# Altium footprint library SOURIAU THD.PcbLib: 34 footprints (part 5 of 5)
Each footprint in its own frame and in the unit in brackets; x right, y up, seen from the top. Pads: shape width x height; smd on the part's side, far side on the other; paste and mask are expansions set on the pad; w line width, h text height; cw(c..) or ccw(c..) is an arc to the next point about the centre after c.
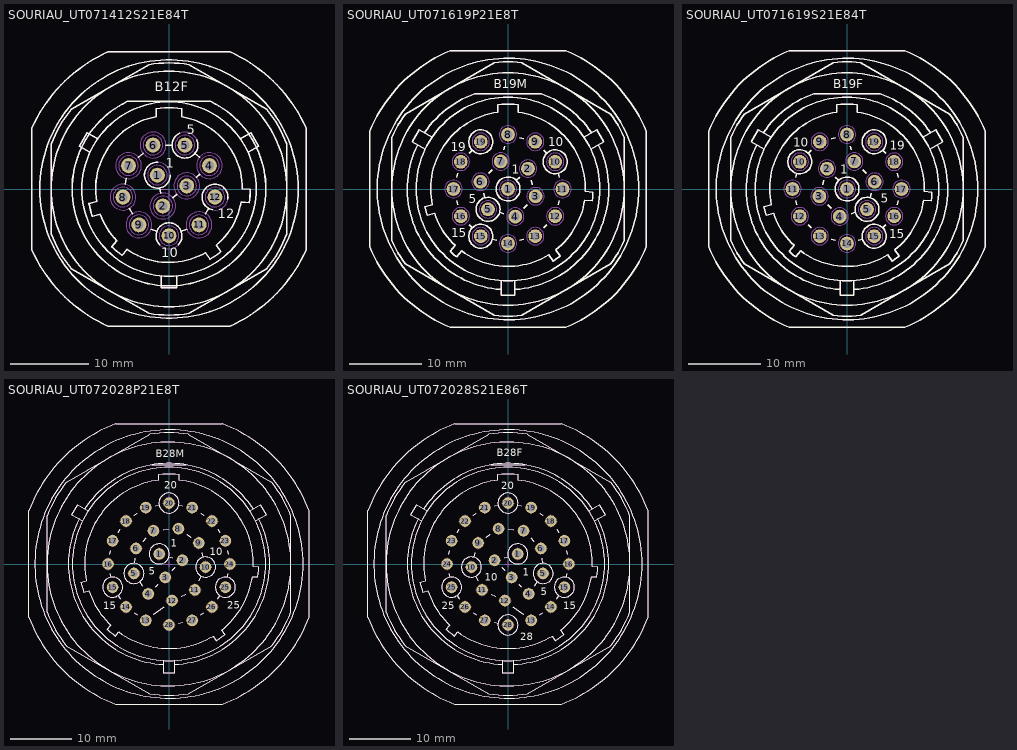
[diagram p4: the footprints below, top view; thin cyan lines are the x and y axes]

## SOURIAU_UT071412S21E84T [mm] "Metal Circular Connector, 12 Female Contacts, Shell Size 14, UT07 Series"
height 24.3
pads (12):
  round 1.9 hole 1.2: 1(-1.478,1.762) 2(-0.787,-2.161) 3(2.265,0.399) 4(5.153,2.975) 5(2.035,5.591) 6(-2.035,5.591) 7(-5.153,2.975) 8(-5.86,-1.033) 9(-3.825,-4.558) 10(0,-5.95) 11(3.825,-4.558) 12(5.86,-1.033)
Top Overlay:
  circle w0.2: c0,0 r11.1
  circle w0.2: c0,0 r16.45
  circle w0.2: c0,0 r15
  lines w0.2: -10.074,4.661 -11.412,5.434 -10.412,7.166 -9.074,6.393 ; -5.573,0.592 -5.439,1.35 ; -5.281,11.15 ccw(c0,0) 5.281,11.15 ; -5.241,11.195 5.321,11.195 ; -5.035,-2.462 -4.65,-3.129 ; -3.889,4.036 -3.299,4.531 ; -2.274,-5.122 -1.55,-5.386 ; -1.454,3.412 ccw(c-1.478,1.762) 0.172,1.772 ; -1.192,0.137 -1.073,-0.536 ; -1.167,-7.117 cw(c0,-5.95) 1.167,-7.117 ; -1,-11.055 -1,-12.6 1,-12.6 1,-11.055 ; -0.385,5.591 0.385,5.591 ; 0.477,-1.101 1.001,-0.661 ; 1.338,7.087 ccw(c2.035,5.591) 3.53,6.288 ; 1.55,-5.386 2.274,-5.122 ; 3.299,4.531 3.889,4.036 ; 3.496,1.498 3.921,1.877 ; 4.65,-3.129 5.035,-2.462 ; 5.573,-2.658 cw(c5.86,-1.033) 7.485,-1.32 ; 9.074,6.393 10.412,7.166 11.412,5.434 10.074,4.661 ; -17.45,-7.766 ccw(c0,0) -7.766,-17.45 7.766,-17.45 ccw(c0,0) 17.45,-7.766 17.45,7.766 ccw(c0,0) 7.766,17.45 -7.766,17.45 ccw(c0,0) -17.45,7.766 -17.45,-7.766 ; -15,-5.71 ccw(c0,0) -12.445,-10.135 -2.555,-15.845 ccw(c0,0) 2.555,-15.845 12.445,-10.135 ccw(c0,0) 15,-5.71 15,5.71 ccw(c0,0) 12.445,10.135 2.555,15.845 ccw(c0,0) -2.555,15.845 -12.445,10.135 ccw(c0,0) -15,5.71 -15,-5.71 ; -10.184,-1.849 ccw(c0,0) -9.744,-3.491 -8.774,-3.231 ccw(c0,0) -6.636,-6.586 -7.282,-7.355 ccw(c0,0) -5.979,-8.448 -5.334,-7.679 ccw(c0,0) 4.644,-8.115 5.22,-8.937 ccw(c0,0) 6.613,-7.962 6.037,-7.14 ccw(c0,0) 9.202,-1.658 10.202,-1.746 ccw(c0,0) 10.35,-0.052 9.35,0.035 ccw(c0,0) 1.65,9.203 1.65,10.218 ccw(c0,0) -1.65,10.218 -1.65,9.203 ccw(c0,0) -9.214,-1.589 -10.184,-1.849
  text "B12F" at -1.837,12.444 h1.2
  text "12" at 6.179,-3.701 h1.2
  text "10" at -0.971,-8.667 h1.2
  text "5" at 2.233,6.965 h1.2
  text "1" at -0.402,2.682 h1.2
Mechanical 8:
  circle w0.1: c-1.478,1.762 r1.65
  circle w0.1: c2.035,5.591 r1.65
  circle w0.1: c5.86,-1.033 r1.65
  circle w0.1: c0,-5.95 r1.65
  circle w0.1: c-5.86,-1.033 r1.65
  circle w0.1: c-5.153,2.975 r1.65
  circle w0.1: c-2.035,5.591 r1.65
  circle w0.1: c-0.787,-2.161 r1.65
  circle w0.1: c-3.825,-4.558 r1.65
  circle w0.1: c3.825,-4.558 r1.65
  circle w0.1: c5.153,2.975 r1.65
  circle w0.1: c2.265,0.399 r1.65
  circle w0.1: c2.265,0.399 r1.25
  circle w0.1: c-0.787,-2.161 r1.25
  circle w0.1: c-1.478,1.762 r1.25
  circle w0.1: c-5.86,-1.033 r1.25
  circle w0.1: c-3.825,-4.558 r1.25
  circle w0.1: c0,-5.95 r1.25
  circle w0.1: c3.825,-4.558 r1.25
  circle w0.1: c5.86,-1.033 r1.25
  circle w0.1: c5.153,2.975 r1.25
  circle w0.1: c2.035,5.591 r1.25
  circle w0.1: c-2.035,5.591 r1.25
  circle w0.1: c-5.153,2.975 r1.25
  lines w0.1: -6.86,-1.033 -5.86,-1.033 -5.86,-2.033 ; -6.153,2.975 -5.153,2.975 -5.153,1.975 ; -4.825,-4.558 -3.825,-4.558 -3.825,-5.558 ; -3.035,5.591 -2.035,5.591 -2.035,4.591 ; -2.478,1.762 -1.478,1.762 -1.478,0.762 ; -1.787,-2.161 -0.787,-2.161 -0.787,-3.161 ; -1,-5.95 0,-5.95 0,-6.95 ; -1,0 0,0 0,-1 ; 1.035,5.591 2.035,5.591 2.035,4.591 ; 1.265,0.399 2.265,0.399 2.265,-0.601 ; 2.825,-4.558 3.825,-4.558 3.825,-5.558 ; 4.153,2.975 5.153,2.975 5.153,1.975 ; 4.86,-1.033 5.86,-1.033 5.86,-2.033
Mechanical 14:
  circle w0.1: c0,0 r11.1
  circle w0.1: c0,0 r16.45
  circle w0.1: c0,0 r15
  lines w0.1: -10.074,4.661 -11.412,5.434 -10.412,7.166 -9.074,6.393 ; -5.573,0.592 -5.439,1.35 ; -5.281,11.15 ccw(c0,0) 5.281,11.15 ; -5.241,11.195 5.321,11.195 ; -5.035,-2.462 -4.65,-3.129 ; -3.889,4.036 -3.299,4.531 ; -2.274,-5.122 -1.55,-5.386 ; -1.454,3.412 ccw(c-1.478,1.762) 0.172,1.772 ; -1.192,0.137 -1.073,-0.536 ; -1.167,-7.117 cw(c0,-5.95) 1.167,-7.117 ; -1,-11.055 -1,-12.6 1,-12.6 1,-11.055 ; -0.385,5.591 0.385,5.591 ; 0.477,-1.101 1.001,-0.661 ; 1.338,7.087 ccw(c2.035,5.591) 3.53,6.288 ; 1.55,-5.386 2.274,-5.122 ; 3.299,4.531 3.889,4.036 ; 3.496,1.498 3.921,1.877 ; 4.65,-3.129 5.035,-2.462 ; 5.573,-2.658 cw(c5.86,-1.033) 7.485,-1.32 ; 9.074,6.393 10.412,7.166 11.412,5.434 10.074,4.661 ; -17.45,-7.766 ccw(c0,0) -7.766,-17.45 7.766,-17.45 ccw(c0,0) 17.45,-7.766 17.45,7.766 ccw(c0,0) 7.766,17.45 -7.766,17.45 ccw(c0,0) -17.45,7.766 -17.45,-7.766 ; -15,-5.71 ccw(c0,0) -12.445,-10.135 -2.555,-15.845 ccw(c0,0) 2.555,-15.845 12.445,-10.135 ccw(c0,0) 15,-5.71 15,5.71 ccw(c0,0) 12.445,10.135 2.555,15.845 ccw(c0,0) -2.555,15.845 -12.445,10.135 ccw(c0,0) -15,5.71 -15,-5.71 ; -10.184,-1.849 ccw(c0,0) -9.744,-3.491 -8.774,-3.231 ccw(c0,0) -6.636,-6.586 -7.282,-7.355 ccw(c0,0) -5.979,-8.448 -5.334,-7.679 ccw(c0,0) 4.644,-8.115 5.22,-8.937 ccw(c0,0) 6.613,-7.962 6.037,-7.14 ccw(c0,0) 9.202,-1.658 10.202,-1.746 ccw(c0,0) 10.35,-0.052 9.35,0.035 ccw(c0,0) 1.65,9.203 1.65,10.218 ccw(c0,0) -1.65,10.218 -1.65,9.203 ccw(c0,0) -9.214,-1.589 -10.184,-1.849
  text "B12F" at -1.837,12.444 h1.2
  text "12" at 6.179,-3.701 h1.2
  text "10" at -0.971,-8.667 h1.2
  text "5" at 2.233,6.965 h1.2
  text "1" at -0.402,2.682 h1.2
3D body "SOURIAU_UT071412S21E84T_NUT.stp": height 11.75, standoff 8.32, extent -15,-16 15,16
3D body "SOURIAU_UT071412S21E84T.stp": height 23.75, standoff -3.6, extent -17.465,-17.465 17.465,17.465

## SOURIAU_UT071619P21E8T [mm] "Metal Circular Connector, 19 Male Contacts, Shell Size 16, UT07 Series"
height 24.3
pads (19):
  round 1.9 hole 1.2: 1(0,0) 2(2.75,2.8) 3(3.8,-1) 4(1,-3.8) 5(-2.75,-2.8) 6(-3.8,1) 7(-1,3.8) 8(0,7.5) 9(3.75,6.5) 10(6.5,3.75) 11(7.5,0) 12(6.5,-3.75) 13(3.75,-6.5) 14(0,-7.5) 15(-3.75,-6.5) 16(-6.5,-3.75) 17(-7.5,0) 18(-6.5,3.75) 19(-3.75,6.5)
Top Overlay:
  circle w0.2: c0,0 r1.65
  circle w0.2: c-2.75,-2.8 r1.65
  circle w0.2: c6.5,3.75 r1.65
  circle w0.2: c-3.75,6.5 r1.65
  circle w0.2: c-3.75,-6.5 r1.65
  circle w0.2: c0,0 r12.65
  circle w0.2: c0,0 r16
  circle w0.2: c0,0 r18
  lines w0.2: -12.452,6.098 ccw(c0,0) -0.946,-13.833 ; -11.507,7.735 cw(c0,0) -4.585,13.085 4.585,13.085 cw(c0,0) 11.507,7.735 ; -11.397,5.489 -13.16,6.507 -12.215,8.143 -10.452,7.126 ; -7.077,-1.594 -6.927,-2.156 ; -7.077,1.594 -6.927,2.156 ; -5.333,-4.917 -4.917,-5.333 ; -5.333,4.917 -4.917,5.333 ; -3.361,-0.59 -3.189,-1.21 ; -2.633,2.167 -2.167,2.633 ; -2.156,-6.927 -1.58,-7.081 ; -1.156,-3.225 -0.594,-3.375 ; -0.945,-12.615 -0.945,-14.65 0.945,-14.65 0.945,-12.615 ; -0.57,5.393 -0.43,5.907 ; 0.944,-13.833 ccw(c0,0) 12.454,6.094 ; 1.156,1.177 1.594,1.623 ; 1.594,7.075 2.156,6.925 ; 1.609,-7.073 2.156,-6.927 ; 2.167,-2.633 2.633,-2.167 ; 3.189,1.21 3.361,0.59 ; 4.917,-5.333 5.333,-4.917 ; 4.917,5.333 5.333,4.917 ; 6.927,-2.156 7.077,-1.595 ; 6.927,2.156 7.077,1.595 ; 10.452,7.126 12.215,8.143 13.16,6.507 11.397,5.489 ; -19.05,-7.97 ccw(c0,0) -7.97,-19.05 7.97,-19.05 ccw(c0,0) 19.05,-7.97 19.05,7.97 ccw(c0,0) 7.97,19.05 -7.97,19.05 ccw(c0,0) -19.05,7.97 -19.05,-7.97 ; -16,-7.089 ccw(c0,0) -14.139,-10.312 -1.861,-17.401 ccw(c0,0) 1.861,-17.401 14.139,-10.312 ccw(c0,0) 16,-7.089 16,7.089 ccw(c0,0) 14.139,10.312 1.861,17.401 ccw(c0,0) -1.861,17.401 -14.139,10.312 ccw(c0,0) -16,7.089 -16,-7.089 ; -11.442,-2.445 ccw(c0,0) -11.131,-3.604 -10.115,-3.332 ccw(c0,0) -7.294,-7.76 -7.97,-8.565 ccw(c0,0) -7.051,-9.337 -6.375,-8.531 ccw(c0,0) 5.607,-9.054 6.211,-9.916 ccw(c0,0) 7.194,-9.227 6.59,-8.366 ccw(c0,0) 10.54,-1.524 11.588,-1.616 ccw(c0,0) 11.692,-0.421 10.645,-0.329 ccw(c0,0) 1.4,10.558 1.4,11.616 ccw(c0,0) -1.4,11.616 -1.4,10.558 ccw(c0,0) -10.426,-2.172 -11.442,-2.445
  text "1" at 0.522,2.079 h1.2
  text "10" at 5.554,5.891 h1.2
  text "15" at -7.797,-6.635 h1.2
  text "5" at -5.429,-1.946 h1.2
  text "19" at -7.866,5.19 h1.2
  text "B19M" at -1.964,13.841 h1.2
Mechanical 8:
  circle w0.1: c0,0 r1.2
  circle w0.1: c-2.75,-2.8 r1.2
  circle w0.1: c-3.75,-6.5 r1.2
  circle w0.1: c-3.75,6.5 r1.2
  circle w0.1: c6.5,3.75 r1.2
  circle w0.1: c0,7.5 r1.2
  circle w0.1: c3.75,6.5 r1.2
  circle w0.1: c7.5,0 r1.2
  circle w0.1: c6.5,-3.75 r1.2
  circle w0.1: c3.75,-6.5 r1.2
  circle w0.1: c0,-7.5 r1.2
  circle w0.1: c-6.5,-3.75 r1.2
  circle w0.1: c-7.5,0 r1.2
  circle w0.1: c-6.5,3.75 r1.2
  circle w0.1: c-3.8,1 r1.2
  circle w0.1: c1,-3.8 r1.2
  circle w0.1: c3.8,-1 r1.2
  circle w0.1: c2.75,2.8 r1.2
  circle w0.1: c-1,3.8 r1.2
  lines w0.1: -8,0 -7.5,0 ; -7.5,-0.5 -7.5,0 ; -7.5,0.5 -7.5,0 ; -7,-3.75 -6.5,-3.75 ; -7,0 -7.5,0 ; -7,3.75 -6.5,3.75 ; -6.5,-4.25 -6.5,-3.75 ; -6.5,-3.25 -6.5,-3.75 ; -6.5,3.25 -6.5,3.75 ; -6.5,4.25 -6.5,3.75 ; -6,-3.75 -6.5,-3.75 ; -6,3.75 -6.5,3.75 ; -4.3,1 -3.8,1 ; -4.25,-6.5 -3.75,-6.5 ; -4.25,6.5 -3.75,6.5 ; -3.8,0.5 -3.8,1 ; -3.8,1.5 -3.8,1 ; -3.75,-7 -3.75,-6.5 ; -3.75,-6 -3.75,-6.5 ; -3.75,6 -3.75,6.5 ; -3.75,7 -3.75,6.5 ; -3.3,1 -3.8,1 ; -3.25,-6.5 -3.75,-6.5 ; -3.25,-2.8 -2.75,-2.8 ; -3.25,6.5 -3.75,6.5 ; -2.75,-3.3 -2.75,-2.8 ; -2.75,-2.3 -2.75,-2.8 ; -2.25,-2.8 -2.75,-2.8 ; -1.5,3.8 -1,3.8 ; -1,3.3 -1,3.8 ; -1,4.3 -1,3.8 ; -0.5,-7.5 0,-7.5 ; -0.5,0 0,0 ; -0.5,3.8 -1,3.8 ; -0.5,7.5 0,7.5 ; 0,-8 0,-7.5 ; 0,-7 0,-7.5 ; 0,-0.5 0,0 ; 0,0.5 0,0 ; 0,7 0,7.5 ; 0,8 0,7.5 ; 0.5,-7.5 0,-7.5 ; 0.5,-3.8 1,-3.8 ; 0.5,0 0,0 ; 0.5,7.5 0,7.5 ; 1,-4.3 1,-3.8 ; 1,-3.3 1,-3.8 ; 1.5,-3.8 1,-3.8 ; 2.25,2.8 2.75,2.8 ; 2.75,2.3 2.75,2.8 ; 2.75,3.3 2.75,2.8 ; 3.25,-6.5 3.75,-6.5 ; 3.25,2.8 2.75,2.8 ; 3.25,6.5 3.75,6.5 ; 3.3,-1 3.8,-1 ; 3.75,-7 3.75,-6.5 ; 3.75,-6 3.75,-6.5 ; 3.75,6 3.75,6.5 ; 3.75,7 3.75,6.5 ; 3.8,-1.5 3.8,-1 ; 3.8,-0.5 3.8,-1 ; 4.25,-6.5 3.75,-6.5 ; 4.25,6.5 3.75,6.5 ; 4.3,-1 3.8,-1 ; 6,-3.75 6.5,-3.75 ; 6,3.75 6.5,3.75 ; 6.5,-4.25 6.5,-3.75 ; 6.5,-3.25 6.5,-3.75 ; 6.5,3.25 6.5,3.75 ; 6.5,4.25 6.5,3.75 ; 7,-3.75 6.5,-3.75 ; 7,0 7.5,0 ; 7,3.75 6.5,3.75 ; 7.5,-0.5 7.5,0 ; 7.5,0.5 7.5,0 ; 8,0 7.5,0
Mechanical 14:
  circle w0.1: c0,0 r18
  circle w0.1: c0,0 r16
  circle w0.1: c0,0 r12.65
  circle w0.1: c-3.75,-6.5 r1.65
  circle w0.1: c-3.75,6.5 r1.65
  circle w0.1: c6.5,3.75 r1.65
  circle w0.1: c-2.75,-2.8 r1.65
  circle w0.1: c0,0 r1.65
  lines w0.1: -12.452,6.098 ccw(c0,0) -0.946,-13.833 ; -11.507,7.735 cw(c0,0) -4.585,13.085 4.585,13.085 cw(c0,0) 11.507,7.735 ; -11.397,5.489 -13.16,6.507 -12.215,8.143 -10.452,7.126 ; -7.077,-1.594 -6.927,-2.156 ; -7.077,1.594 -6.927,2.156 ; -5.333,-4.917 -4.917,-5.333 ; -5.333,4.917 -4.917,5.333 ; -3.361,-0.59 -3.189,-1.21 ; -2.633,2.167 -2.167,2.633 ; -2.156,-6.927 -1.58,-7.081 ; -1.156,-3.225 -0.594,-3.375 ; -0.945,-12.615 -0.945,-14.65 0.945,-14.65 0.945,-12.615 ; -0.57,5.393 -0.43,5.907 ; 0.944,-13.833 ccw(c0,0) 12.454,6.094 ; 1.156,1.177 1.594,1.623 ; 1.594,7.075 2.156,6.925 ; 1.609,-7.073 2.156,-6.927 ; 2.167,-2.633 2.633,-2.167 ; 3.189,1.21 3.361,0.59 ; 4.917,-5.333 5.333,-4.917 ; 4.917,5.333 5.333,4.917 ; 6.927,-2.156 7.077,-1.595 ; 6.927,2.156 7.077,1.595 ; 10.452,7.126 12.215,8.143 13.16,6.507 11.397,5.489 ; -19.05,-7.97 ccw(c0,0) -7.97,-19.05 7.97,-19.05 ccw(c0,0) 19.05,-7.97 19.05,7.97 ccw(c0,0) 7.97,19.05 -7.97,19.05 ccw(c0,0) -19.05,7.97 -19.05,-7.97 ; -16,-7.089 ccw(c0,0) -14.139,-10.312 -1.861,-17.401 ccw(c0,0) 1.861,-17.401 14.139,-10.312 ccw(c0,0) 16,-7.089 16,7.089 ccw(c0,0) 14.139,10.312 1.861,17.401 ccw(c0,0) -1.861,17.401 -14.139,10.312 ccw(c0,0) -16,7.089 -16,-7.089 ; -11.442,-2.445 ccw(c0,0) -11.131,-3.604 -10.115,-3.332 ccw(c0,0) -7.294,-7.76 -7.97,-8.565 ccw(c0,0) -7.051,-9.337 -6.375,-8.531 ccw(c0,0) 5.607,-9.054 6.211,-9.916 ccw(c0,0) 7.194,-9.227 6.59,-8.366 ccw(c0,0) 10.54,-1.524 11.588,-1.616 ccw(c0,0) 11.692,-0.421 10.645,-0.329 ccw(c0,0) 1.4,10.558 1.4,11.616 ccw(c0,0) -1.4,11.616 -1.4,10.558 ccw(c0,0) -10.426,-2.172 -11.442,-2.445
  text "19" at -7.866,5.19 h1.2
  text "5" at -5.429,-1.946 h1.2
  text "15" at -7.797,-6.635 h1.2
  text "10" at 5.554,5.891 h1.2
  text "1" at 0.522,2.079 h1.2
  text "B19M" at -1.964,13.841 h1.2
3D body "SOURIAU_UT071619P21E8T.stp": height 31.35, standoff -3.6, extent -19.05,-19.05 19.05,19.05
3D body "SOURIAU_UT071619P21E8T_NUT.stp": height 19.35, standoff 15.92, extent -16,-17.489 16,17.489

## SOURIAU_UT071619S21E84T [mm] "Metal Circular Connector, 19 Female Contacts, Shell Size 16, UT07 Series"
height 24.3
pads (19):
  round 1.9 hole 1.2: 1(0,0) 2(-2.75,2.8) 3(-3.8,-1) 4(-1,-3.8) 5(2.75,-2.8) 6(3.8,1) 7(1,3.8) 8(0,7.5) 9(-3.75,6.5) 10(-6.5,3.75) 11(-7.5,0) 12(-6.5,-3.75) 13(-3.75,-6.5) 14(0,-7.5) 15(3.75,-6.5) 16(6.5,-3.75) 17(7.5,0) 18(6.5,3.75) 19(3.75,6.5)
Top Overlay:
  circle w0.2: c0,0 r1.65
  circle w0.2: c2.75,-2.8 r1.65
  circle w0.2: c-6.5,3.75 r1.65
  circle w0.2: c3.75,-6.5 r1.65
  circle w0.2: c0,0 r12.65
  circle w0.2: c0,0 r16
  circle w0.2: c0,0 r18
  circle w0.2: c3.75,6.5 r1.65
  lines w0.2: -11.505,7.739 cw(c0,0) -4.585,13.085 4.585,13.085 cw(c0,0) 11.504,7.74 ; -11.397,5.489 -13.16,6.507 -12.215,8.143 -10.452,7.126 ; -7.077,-1.595 -6.927,-2.156 ; -7.077,1.595 -6.927,2.156 ; -5.333,-4.917 -4.917,-5.333 ; -5.333,4.917 -4.917,5.333 ; -3.361,0.59 -3.189,1.21 ; -2.633,-2.167 -2.167,-2.633 ; -2.156,-6.927 -1.609,-7.073 ; -2.156,6.925 -1.594,7.075 ; -1.594,1.623 -1.156,1.177 ; -0.945,-12.615 -0.945,-14.65 0.945,-14.65 0.945,-12.615 ; 0.43,5.907 0.57,5.393 ; 0.594,-3.375 1.156,-3.225 ; 0.952,-13.832 ccw(c0,0) 12.452,6.098 ; 1.58,-7.081 2.156,-6.927 ; 2.167,2.633 2.633,2.167 ; 3.189,-1.21 3.361,-0.59 ; 4.917,-5.333 5.333,-4.917 ; 4.917,5.333 5.333,4.917 ; 6.927,-2.156 7.077,-1.594 ; 6.927,2.156 7.077,1.594 ; 10.452,7.126 12.215,8.143 13.16,6.507 11.397,5.489 ; -19.05,-7.97 ccw(c0,0) -7.97,-19.05 7.97,-19.05 ccw(c0,0) 19.05,-7.97 19.05,7.97 ccw(c0,0) 7.97,19.05 -7.97,19.05 ccw(c0,0) -19.05,7.97 -19.05,-7.97 ; -16,-7.089 ccw(c0,0) -14.139,-10.312 -1.861,-17.401 ccw(c0,0) 1.861,-17.401 14.139,-10.312 ccw(c0,0) 16,-7.089 16,7.089 ccw(c0,0) 14.139,10.312 1.861,17.401 ccw(c0,0) -1.861,17.401 -14.139,10.312 ccw(c0,0) -16,7.089 -16,-7.089 ; -12.456,6.09 ccw(c0,0) -0.947,-13.833 cw(c0,0) -12.456,6.09 ; -11.442,-2.445 ccw(c0,0) -11.131,-3.604 -10.115,-3.332 ccw(c0,0) -7.294,-7.76 -7.97,-8.565 ccw(c0,0) -7.051,-9.337 -6.375,-8.531 ccw(c0,0) 5.607,-9.054 6.211,-9.916 ccw(c0,0) 7.194,-9.227 6.59,-8.366 ccw(c0,0) 10.54,-1.524 11.588,-1.616 ccw(c0,0) 11.692,-0.421 10.645,-0.329 ccw(c0,0) 1.4,10.558 1.4,11.616 ccw(c0,0) -1.4,11.616 -1.4,10.558 ccw(c0,0) -10.426,-2.172 -11.442,-2.445
  text "B19F" at -1.887,13.856 h1.2
  text "1" at -0.9,2.075 h1.2
  text "10" at -7.4,5.8 h1.2
  text "15" at 5.8,-6.75 h1.2
  text "5" at 4.625,-1.9 h1.2
  text "19" at 5.875,5.375 h1.2
Mechanical 8:
  circle w0.1: c1,3.8 r1.2
  circle w0.1: c-2.75,2.8 r1.2
  circle w0.1: c-3.8,-1 r1.2
  circle w0.1: c-1,-3.8 r1.2
  circle w0.1: c3.8,1 r1.2
  circle w0.1: c6.5,3.75 r1.2
  circle w0.1: c7.5,0 r1.2
  circle w0.1: c6.5,-3.75 r1.2
  circle w0.1: c0,-7.5 r1.2
  circle w0.1: c-3.75,-6.5 r1.2
  circle w0.1: c-6.5,-3.75 r1.2
  circle w0.1: c-7.5,0 r1.2
  circle w0.1: c-3.75,6.5 r1.2
  circle w0.1: c0,7.5 r1.2
  circle w0.1: c-6.5,3.75 r1.2
  circle w0.1: c3.75,6.5 r1.2
  circle w0.1: c3.75,-6.5 r1.2
  circle w0.1: c2.75,-2.8 r1.2
  circle w0.1: c0,0 r1.2
  lines w0.1: -8,0 -7.5,0 ; -7.5,-0.5 -7.5,0 ; -7.5,0.5 -7.5,0 ; -7,-3.75 -6.5,-3.75 ; -7,0 -7.5,0 ; -7,3.75 -6.5,3.75 ; -6.5,-4.25 -6.5,-3.75 ; -6.5,-3.25 -6.5,-3.75 ; -6.5,3.25 -6.5,3.75 ; -6.5,4.25 -6.5,3.75 ; -6,-3.75 -6.5,-3.75 ; -6,3.75 -6.5,3.75 ; -4.3,-1 -3.8,-1 ; -4.25,-6.5 -3.75,-6.5 ; -4.25,6.5 -3.75,6.5 ; -3.8,-1.5 -3.8,-1 ; -3.8,-0.5 -3.8,-1 ; -3.75,-7 -3.75,-6.5 ; -3.75,-6 -3.75,-6.5 ; -3.75,6 -3.75,6.5 ; -3.75,7 -3.75,6.5 ; -3.3,-1 -3.8,-1 ; -3.25,-6.5 -3.75,-6.5 ; -3.25,2.8 -2.75,2.8 ; -3.25,6.5 -3.75,6.5 ; -2.75,2.3 -2.75,2.8 ; -2.75,3.3 -2.75,2.8 ; -2.25,2.8 -2.75,2.8 ; -1.5,-3.8 -1,-3.8 ; -1,-4.3 -1,-3.8 ; -1,-3.3 -1,-3.8 ; -0.5,-7.5 0,-7.5 ; -0.5,-3.8 -1,-3.8 ; -0.5,0 0,0 ; -0.5,7.5 0,7.5 ; 0,-8 0,-7.5 ; 0,-7 0,-7.5 ; 0,-0.5 0,0 ; 0,0.5 0,0 ; 0,7 0,7.5 ; 0,8 0,7.5 ; 0.5,-7.5 0,-7.5 ; 0.5,0 0,0 ; 0.5,3.8 1,3.8 ; 0.5,7.5 0,7.5 ; 1,3.3 1,3.8 ; 1,4.3 1,3.8 ; 1.5,3.8 1,3.8 ; 2.25,-2.8 2.75,-2.8 ; 2.75,-3.3 2.75,-2.8 ; 2.75,-2.3 2.75,-2.8 ; 3.25,-6.5 3.75,-6.5 ; 3.25,-2.8 2.75,-2.8 ; 3.25,6.5 3.75,6.5 ; 3.3,1 3.8,1 ; 3.75,-7 3.75,-6.5 ; 3.75,-6 3.75,-6.5 ; 3.75,6 3.75,6.5 ; 3.75,7 3.75,6.5 ; 3.8,0.5 3.8,1 ; 3.8,1.5 3.8,1 ; 4.25,-6.5 3.75,-6.5 ; 4.25,6.5 3.75,6.5 ; 4.3,1 3.8,1 ; 6,-3.75 6.5,-3.75 ; 6,3.75 6.5,3.75 ; 6.5,-4.25 6.5,-3.75 ; 6.5,-3.25 6.5,-3.75 ; 6.5,3.25 6.5,3.75 ; 6.5,4.25 6.5,3.75 ; 7,-3.75 6.5,-3.75 ; 7,0 7.5,0 ; 7,3.75 6.5,3.75 ; 7.5,-0.5 7.5,0 ; 7.5,0.5 7.5,0 ; 8,0 7.5,0
Mechanical 14:
  circle w0.1: c3.75,6.5 r1.65
  circle w0.1: c0,0 r18
  circle w0.1: c0,0 r16
  circle w0.1: c0,0 r12.65
  circle w0.1: c3.75,-6.5 r1.65
  circle w0.1: c-6.5,3.75 r1.65
  circle w0.1: c2.75,-2.8 r1.65
  circle w0.1: c0,0 r1.65
  lines w0.1: -12.456,6.09 ccw(c0,0) -0.947,-13.833 ; -11.505,7.739 cw(c0,0) -4.585,13.085 4.585,13.085 cw(c0,0) 11.504,7.74 ; -11.397,5.489 -13.16,6.507 -12.215,8.143 -10.452,7.126 ; -7.077,-1.595 -6.927,-2.156 ; -7.077,1.595 -6.927,2.156 ; -5.333,-4.917 -4.917,-5.333 ; -5.333,4.917 -4.917,5.333 ; -3.361,0.59 -3.189,1.21 ; -2.633,-2.167 -2.167,-2.633 ; -2.156,-6.927 -1.609,-7.073 ; -2.156,6.925 -1.594,7.075 ; -1.594,1.623 -1.156,1.177 ; -0.945,-12.615 -0.945,-14.65 0.945,-14.65 0.945,-12.615 ; 0.43,5.907 0.57,5.393 ; 0.594,-3.375 1.156,-3.225 ; 0.952,-13.832 ccw(c0,0) 12.452,6.098 ; 1.58,-7.081 2.156,-6.927 ; 2.167,2.633 2.633,2.167 ; 3.189,-1.21 3.361,-0.59 ; 4.917,-5.333 5.333,-4.917 ; 4.917,5.333 5.333,4.917 ; 6.927,-2.156 7.077,-1.594 ; 6.927,2.156 7.077,1.594 ; 10.452,7.126 12.215,8.143 13.16,6.507 11.397,5.489 ; -19.05,-7.97 ccw(c0,0) -7.97,-19.05 7.97,-19.05 ccw(c0,0) 19.05,-7.97 19.05,7.97 ccw(c0,0) 7.97,19.05 -7.97,19.05 ccw(c0,0) -19.05,7.97 -19.05,-7.97 ; -16,-7.089 ccw(c0,0) -14.139,-10.312 -1.861,-17.401 ccw(c0,0) 1.861,-17.401 14.139,-10.312 ccw(c0,0) 16,-7.089 16,7.089 ccw(c0,0) 14.139,10.312 1.861,17.401 ccw(c0,0) -1.861,17.401 -14.139,10.312 ccw(c0,0) -16,7.089 -16,-7.089 ; -11.442,-2.445 ccw(c0,0) -11.131,-3.604 -10.115,-3.332 ccw(c0,0) -7.294,-7.76 -7.97,-8.565 ccw(c0,0) -7.051,-9.337 -6.375,-8.531 ccw(c0,0) 5.607,-9.054 6.211,-9.916 ccw(c0,0) 7.194,-9.227 6.59,-8.366 ccw(c0,0) 10.54,-1.524 11.588,-1.616 ccw(c0,0) 11.692,-0.421 10.645,-0.329 ccw(c0,0) 1.4,10.558 1.4,11.616 ccw(c0,0) -1.4,11.616 -1.4,10.558 ccw(c0,0) -10.426,-2.172 -11.442,-2.445
  text "19" at 5.875,5.375 h1.2
  text "5" at 4.625,-1.9 h1.2
  text "15" at 5.8,-6.75 h1.2
  text "10" at -7.4,5.8 h1.2
  text "1" at -0.9,2.075 h1.2
  text "B19F" at -1.887,13.856 h1.2
3D body "SOURIAU_UT071619S21E84T_NUT.stp": height 11.75, standoff 8.32, extent -16,-17.489 16,17.489
3D body "SOURIAU_UT071619S21E84T.stp": height 23.75, standoff -3.6, extent -19.05,-19.05 19.05,19.05

## SOURIAU_UT072028P21E8T [mm] "Metal Circular Connector, 28 Male Contacts, Shell Size 20, UT07 Series"
height 32.6
pads (28):
  round 1.9 hole 1.2: 1(-1.6,1.65) 2(2.2,0.6) 3(-0.6,-2.2) 4(-3.4,-4.9) 5(-5.75,-1.55) 6(-5.4,2.55) 7(-2.55,5.45) 8(1.55,5.8) 9(4.9,3.45) 10(6,-0.5) 11(4.25,-4.25) 12(0.5,-6) 13(-3.8,-9.25) 14(-7.05,-7.05) 15(-9.25,-3.8) 16(-10,0) 17(-9.25,3.8) 18(-7.05,7.05) 19(-3.8,9.25) 20(0,10) 21(3.8,9.25) 22(7.05,7.05) 23(9.25,3.8) 24(10,0) 25(9.25,-3.8) 26(7.05,-7.05) 27(3.8,-9.25) 28(0,-10)
Top Overlay:
  circle w0.2: c9.25,-3.8 r1.65
  circle w0.2: c0,10 r1.65
  circle w0.2: c-9.25,-3.8 r1.65
  circle w0.2: c6,-0.5 r1.65
  circle w0.2: c-5.75,-1.55 r1.65
  circle w0.2: c-1.6,1.65 r1.65
  circle w0.2: c0,0 r15.85
  circle w0.2: c0,0 r20
  circle w0.2: c0,0 r22
  lines w0.2: -14.739,7.418 ccw(c0,0) -0.945,-16.473 ; -14.175,7.092 -15.931,8.107 -14.986,9.743 -13.229,8.729 ; -13.793,9.055 cw(c0,0) 13.793,9.055 ; -9.681,-1.619 -9.57,-2.181 ; -9.681,1.619 -9.57,2.181 ; -8.325,-5.166 -7.975,-5.684 ; -8.325,5.166 -7.975,5.684 ; -5.684,-7.975 -5.166,-8.325 ; -5.684,7.975 -5.166,8.325 ; -5.61,0.094 -5.54,0.906 ; -4.802,-2.901 -4.348,-3.549 ; -4.243,3.727 -3.707,4.273 ; -2.804,16.26 2.804,16.26 ; -2.484,-8.255 -0.816,-6.995 ; -2.212,-3.755 -1.788,-3.345 ; -2.181,9.57 -1.619,9.681 ; -0.945,-15.822 -0.945,-17.85 0.945,-17.85 0.945,-15.822 ; -0.906,5.59 -0.094,5.66 ; -0.01,1.211 0.61,1.039 ; 0.567,-1.033 1.033,-0.567 ; 0.945,-16.473 ccw(c0,0) 14.738,7.418 ; 1.619,-9.681 2.181,-9.57 ; 1.619,9.681 2.181,9.57 ; 1.995,-5.302 2.755,-4.948 ; 2.901,4.852 3.549,4.398 ; 4.948,-2.755 5.302,-1.995 ; 5.166,-8.325 5.684,-7.975 ; 5.166,8.325 5.684,7.975 ; 5.343,1.86 5.557,1.09 ; 7.451,-12.122 7.668,-12.433 ; 7.975,-5.684 8.325,-5.166 ; 7.975,5.684 8.325,5.166 ; 8.843,-11.147 9.061,-11.458 ; 9.57,-2.181 9.681,-1.619 ; 9.57,2.181 9.681,1.619 ; 13.229,8.729 14.986,9.743 15.931,8.107 14.175,7.093 ; -23.01,-8.701 ccw(c0,0) -8.701,-23.01 8.701,-23.01 ccw(c0,0) 23.01,-8.701 23.01,8.701 ccw(c0,0) 8.701,23.01 -8.701,23.01 ccw(c0,0) -23.01,8.701 -23.01,-8.701 ; -20,-7.89 ccw(c0,0) -16.833,-13.376 -3.167,-21.265 ccw(c0,0) 3.167,-21.265 16.833,-13.376 ccw(c0,0) 20,-7.89 20,7.89 ccw(c0,0) 16.833,13.376 3.167,21.265 ccw(c0,0) -3.167,21.265 -16.833,13.376 ccw(c0,0) -20,7.89 -20,-7.89 ; -14.444,-2.99 ccw(c-0.029,-0.008) -14.004,-4.632 -13.133,-4.399 ccw(c0,0) -9.537,-10.043 -10.116,-10.734 ccw(c-0.049,-0.061) -8.814,-11.827 -8.235,-11.136 ccw(c0,0) 7.233,-11.811 7.75,-12.55 ccw(c0,0) 9.142,-11.575 8.625,-10.836 ccw(c0,0) 13.697,-2.052 14.595,-2.13 ccw(c0,0) 14.744,-0.437 13.845,-0.358 ccw(c0,0) 1.65,13.751 1.65,14.657 ccw(c0,0) -1.65,14.657 -1.65,13.751 ccw(c0,0) -13.573,-2.757 -14.444,-2.99
  text "B28M" at -2.187,17.481 h1.2
  text "20" at -0.811,12.345 h1.2
  text "15" at -10.792,-7.424 h1.2
  text "5" at -3.288,-1.79 h1.2
  text "10" at 6.687,1.424 h1.2
  text "1" at 0.302,2.828 h1.2
  text "25" at 9.537,-7.356 h1.2
Mechanical 8:
  lines w0.1: -11,0 -10,0 ; -10.25,-3.8 -9.25,-3.8 ; -10.25,3.8 -9.25,3.8 ; -10,-1 -10,0 ; -10,1 -10,0 ; -9.25,-4.8 -9.25,-3.8 ; -9.25,-2.8 -9.25,-3.8 ; -9.25,2.8 -9.25,3.8 ; -9.25,4.8 -9.25,3.8 ; -9,0 -10,0 ; -8.25,-3.8 -9.25,-3.8 ; -8.25,3.8 -9.25,3.8 ; -8.05,-7.05 -7.05,-7.05 ; -8.05,7.05 -7.05,7.05 ; -7.05,-8.05 -7.05,-7.05 ; -7.05,-6.05 -7.05,-7.05 ; -7.05,6.05 -7.05,7.05 ; -7.05,8.05 -7.05,7.05 ; -6.75,-1.55 -5.75,-1.55 ; -6.4,2.55 -5.4,2.55 ; -6.05,-7.05 -7.05,-7.05 ; -6.05,7.05 -7.05,7.05 ; -5.75,-2.55 -5.75,-1.55 ; -5.75,-0.55 -5.75,-1.55 ; -5.4,1.55 -5.4,2.55 ; -5.4,3.55 -5.4,2.55 ; -4.8,-9.25 -3.8,-9.25 ; -4.8,9.25 -3.8,9.25 ; -4.75,-1.55 -5.75,-1.55 ; -4.4,-4.9 -3.4,-4.9 ; -4.4,2.55 -5.4,2.55 ; -3.8,-10.25 -3.8,-9.25 ; -3.8,-8.25 -3.8,-9.25 ; -3.8,8.25 -3.8,9.25 ; -3.8,10.25 -3.8,9.25 ; -3.55,5.45 -2.55,5.45 ; -3.4,-5.9 -3.4,-4.9 ; -3.4,-3.9 -3.4,-4.9 ; -2.8,-9.25 -3.8,-9.25 ; -2.8,9.25 -3.8,9.25 ; -2.6,1.65 -1.6,1.65 ; -2.55,4.45 -2.55,5.45 ; -2.55,6.45 -2.55,5.45 ; -2.4,-4.9 -3.4,-4.9 ; -1.6,-2.2 -0.6,-2.2 ; -1.6,0.65 -1.6,1.65 ; -1.6,2.65 -1.6,1.65 ; -1.55,5.45 -2.55,5.45 ; -1,-10 0,-10 ; -1,10 0,10 ; -0.6,-3.2 -0.6,-2.2 ; -0.6,-1.2 -0.6,-2.2 ; -0.6,1.65 -1.6,1.65 ; -0.5,-6 0.5,-6 ; -0.5,0 0,0 ; 0,-11 0,-10 ; 0,-9 0,-10 ; 0,-0.5 0,0 ; 0,0.5 0,0 ; 0,9 0,10 ; 0,11 0,10 ; 0.4,-2.2 -0.6,-2.2 ; 0.5,-7 0.5,-6 ; 0.5,-5 0.5,-6 ; 0.5,0 0,0 ; 0.55,5.8 1.55,5.8 ; 1,-10 0,-10 ; 1,10 0,10 ; 1.2,0.6 2.2,0.6 ; 1.5,-6 0.5,-6 ; 1.55,4.8 1.55,5.8 ; 1.55,6.8 1.55,5.8 ; 2.2,-0.4 2.2,0.6 ; 2.2,1.6 2.2,0.6 ; 2.55,5.8 1.55,5.8 ; 2.8,-9.25 3.8,-9.25 ; 2.8,9.25 3.8,9.25 ; 3.2,0.6 2.2,0.6 ; 3.25,-4.25 4.25,-4.25 ; 3.8,-10.25 3.8,-9.25 ; 3.8,-8.25 3.8,-9.25 ; 3.8,8.25 3.8,9.25 ; 3.8,10.25 3.8,9.25 ; 3.9,3.45 4.9,3.45 ; 4.25,-5.25 4.25,-4.25 ; 4.25,-3.25 4.25,-4.25 ; 4.8,-9.25 3.8,-9.25 ; 4.8,9.25 3.8,9.25 ; 4.9,2.45 4.9,3.45 ; 4.9,4.45 4.9,3.45 ; 5,-0.5 6,-0.5 ; 5.25,-4.25 4.25,-4.25 ; 5.9,3.45 4.9,3.45 ; 6,-1.5 6,-0.5 ; 6,0.5 6,-0.5 ; 6.05,-7.05 7.05,-7.05 ; 6.05,7.05 7.05,7.05 ; 7,-0.5 6,-0.5 ; 7.05,-8.05 7.05,-7.05 ; 7.05,-6.05 7.05,-7.05 ; 7.05,6.05 7.05,7.05 ; 7.05,8.05 7.05,7.05 ; 8.05,-7.05 7.05,-7.05 ; 8.05,7.05 7.05,7.05 ; 8.25,-3.8 9.25,-3.8 ; 8.25,3.8 9.25,3.8 ; 9,0 10,0 ; 9.25,-4.8 9.25,-3.8 ; 9.25,-2.8 9.25,-3.8 ; 9.25,2.8 9.25,3.8 ; 9.25,4.8 9.25,3.8 ; 10,-1 10,0 ; 10,1 10,0 ; 10.25,-3.8 9.25,-3.8 ; 10.25,3.8 9.25,3.8 ; 11,0 10,0
Mechanical 14:
  circle w0.1: c0,-10 r0.8
  circle w0.1: c3.8,-9.25 r0.8
  circle w0.1: c7.05,-7.05 r0.8
  circle w0.1: c4.25,-4.25 r0.8
  circle w0.1: c-0.6,-2.2 r0.8
  circle w0.1: c2.2,0.6 r0.8
  circle w0.1: c4.9,3.45 r0.8
  circle w0.1: c1.55,5.8 r0.8
  circle w0.1: c-2.55,5.45 r0.8
  circle w0.1: c-5.4,2.55 r0.8
  circle w0.1: c-3.4,-4.9 r0.8
  circle w0.1: c0.5,-6 r0.8
  circle w0.1: c-3.8,-9.25 r0.8
  circle w0.1: c-7.05,-7.05 r0.8
  circle w0.1: c-10,0 r0.8
  circle w0.1: c-9.25,3.8 r0.8
  circle w0.1: c-7.05,7.05 r0.8
  circle w0.1: c-3.8,9.25 r0.8
  circle w0.1: c3.8,9.25 r0.8
  circle w0.1: c7.05,7.05 r0.8
  circle w0.1: c9.25,3.8 r0.8
  circle w0.1: c10,0 r0.8
  circle w0.1: c9.25,-3.8 r1.65
  circle w0.1: c0,10 r1.65
  circle w0.1: c-9.25,-3.8 r1.65
  circle w0.1: c6,-0.5 r1.65
  circle w0.1: c-5.75,-1.55 r1.65
  circle w0.1: c-1.6,1.65 r1.65
  circle w0.1: c0,0 r15.85
  circle w0.1: c0,0 r20
  circle w0.1: c0,0 r22
  lines w0.1: -14.739,7.418 ccw(c0,0) -0.945,-16.473 ; -14.175,7.092 -15.931,8.107 -14.986,9.743 -13.229,8.729 ; -13.793,9.055 cw(c0,0) 13.793,9.055 ; -9.681,-1.619 -9.57,-2.181 ; -9.681,1.619 -9.57,2.181 ; -8.325,-5.166 -7.975,-5.684 ; -8.325,5.166 -7.975,5.684 ; -5.684,-7.975 -5.166,-8.325 ; -5.684,7.975 -5.166,8.325 ; -5.61,0.094 -5.54,0.906 ; -4.802,-2.901 -4.348,-3.549 ; -4.243,3.727 -3.707,4.273 ; -2.484,-8.255 -0.816,-6.995 ; -2.212,-3.755 -1.788,-3.345 ; -2.181,9.57 -1.619,9.681 ; -0.945,-15.822 -0.945,-17.85 0.945,-17.85 0.945,-15.822 ; -0.906,5.59 -0.094,5.66 ; -0.01,1.211 0.61,1.039 ; 0.567,-1.033 1.033,-0.567 ; 0.945,-16.473 ccw(c0,0) 14.738,7.418 ; 1.619,-9.681 2.181,-9.57 ; 1.619,9.681 2.181,9.57 ; 1.995,-5.302 2.755,-4.948 ; 2.901,4.852 3.549,4.398 ; 4.948,-2.755 5.302,-1.995 ; 5.166,-8.325 5.684,-7.975 ; 5.166,8.325 5.684,7.975 ; 5.343,1.86 5.557,1.09 ; 7.451,-12.122 7.668,-12.433 ; 7.975,-5.684 8.325,-5.166 ; 7.975,5.684 8.325,5.166 ; 8.843,-11.147 9.061,-11.458 ; 9.57,-2.181 9.681,-1.619 ; 9.57,2.181 9.681,1.619 ; 13.229,8.729 14.986,9.743 15.931,8.107 14.175,7.093 ; -2.804,16.26 2.804,16.26 ; -2.804,16.26 2.804,16.26 ; -2.804,16.26 2.804,16.26 ; -23.01,-8.701 ccw(c0,0) -8.701,-23.01 8.701,-23.01 ccw(c0,0) 23.01,-8.701 23.01,8.701 ccw(c0,0) 8.701,23.01 -8.701,23.01 ccw(c0,0) -23.01,8.701 -23.01,-8.701 ; -20,-7.89 ccw(c0,0) -16.833,-13.376 -3.167,-21.265 ccw(c0,0) 3.167,-21.265 16.833,-13.376 ccw(c0,0) 20,-7.89 20,7.89 ccw(c0,0) 16.833,13.376 3.167,21.265 ccw(c0,0) -3.167,21.265 -16.833,13.376 ccw(c0,0) -20,7.89 -20,-7.89 ; -14.444,-2.99 ccw(c-0.029,-0.008) -14.004,-4.632 -13.133,-4.399 ccw(c0,0) -9.537,-10.043 -10.116,-10.734 ccw(c-0.049,-0.061) -8.814,-11.827 -8.235,-11.136 ccw(c0,0) 7.233,-11.811 7.75,-12.55 ccw(c0,0) 9.142,-11.575 8.625,-10.836 ccw(c0,0) 13.697,-2.052 14.595,-2.13 ccw(c0,0) 14.744,-0.437 13.845,-0.358 ccw(c0,0) 1.65,13.751 1.65,14.657 ccw(c0,0) -1.65,14.657 -1.65,13.751 ccw(c0,0) -13.573,-2.757 -14.444,-2.99
  text "B28M" at -2.187,17.481 h1.2
  text "20" at -0.811,12.345 h1.2
  text "15" at -10.792,-7.424 h1.2
  text "5" at -3.288,-1.79 h1.2
  text "10" at 6.687,1.424 h1.2
  text "1" at 0.302,2.828 h1.2
  text "25" at 9.537,-7.356 h1.2
3D body "SOURIAU_UT072028P21E8T_NUT.stp": height 15.87, standoff 12.44, extent -20,-21.5 20,21.5
3D body "SOURIAU_UT072028P21E8T.stp": height 32.65, standoff -3.6, extent -23.01,-23.01 23.01,23.01

## SOURIAU_UT072028S21E86T [mm] "Metal Circular Connector, 28 Female Contacts, Shell Size 20, UT07 Series"
height 26.5
pads (28):
  round 1.9 hole 1.2: 1(1.6,1.65) 2(-2.2,0.6) 3(0.6,-2.2) 4(3.4,-4.9) 5(5.75,-1.55) 6(5.4,2.55) 7(2.55,5.45) 8(-1.55,5.8) 9(-4.9,3.45) 10(-6,-0.5) 11(-4.25,-4.25) 12(-0.5,-6) 13(3.8,-9.25) 14(7.05,-7.05) 15(9.25,-3.8) 16(10,0) 17(9.25,3.8) 18(7.05,7.05) 19(3.8,9.25) 20(0,10) 21(-3.8,9.25) 22(-7.05,7.05) 23(-9.25,3.8) 24(-10,0) 25(-9.25,-3.8) 26(-7.05,-7.05) 27(-3.8,-9.25) 28(0,-10)
Top Overlay:
  circle w0.2: c-9.25,-3.8 r1.65
  circle w0.2: c1.6,1.65 r1.65
  circle w0.2: c5.75,-1.55 r1.65
  circle w0.2: c-6,-0.5 r1.65
  circle w0.2: c9.25,-3.8 r1.65
  circle w0.2: c0,-10 r1.65
  circle w0.2: c0,10 r1.65
  circle w0.2: c0,0 r15.85
  circle w0.2: c0,0 r20
  circle w0.2: c0,0 r22
  lines w0.2: -14.739,7.418 ccw(c0,0) -0.945,-16.473 ; -14.175,7.092 -15.931,8.107 -14.986,9.743 -13.229,8.729 ; -13.793,9.055 cw(c0,0) 13.793,9.055 ; -9.681,-1.619 -9.57,-2.181 ; -9.681,1.619 -9.57,2.181 ; -8.325,-5.166 -7.975,-5.684 ; -8.325,5.166 -7.975,5.684 ; -5.684,-7.975 -5.166,-8.325 ; -5.684,7.975 -5.166,8.325 ; -5.557,1.09 -5.343,1.86 ; -5.302,-1.995 -4.948,-2.755 ; -3.549,4.398 -2.901,4.852 ; -2.804,16.26 2.804,16.26 ; -2.755,-4.948 -1.995,-5.302 ; -2.181,-9.57 -1.619,-9.681 ; -2.181,9.57 -1.619,9.681 ; -1.033,-0.567 -0.567,-1.033 ; -0.945,-15.822 -0.945,-17.85 0.945,-17.85 0.945,-15.822 ; -0.61,1.039 0.01,1.211 ; 0.094,5.66 0.906,5.59 ; 0.816,-6.995 2.484,-8.255 ; 0.945,-16.473 ccw(c0,0) 14.738,7.418 ; 1.619,9.681 2.181,9.57 ; 1.788,-3.345 2.212,-3.755 ; 3.707,4.273 4.243,3.727 ; 4.348,-3.549 4.802,-2.901 ; 5.166,-8.325 5.684,-7.975 ; 5.166,8.325 5.684,7.975 ; 5.54,0.906 5.61,0.094 ; 7.451,-12.122 7.668,-12.433 ; 7.975,-5.684 8.325,-5.166 ; 7.975,5.684 8.325,5.166 ; 8.843,-11.147 9.061,-11.458 ; 9.57,-2.181 9.681,-1.619 ; 9.57,2.181 9.681,1.619 ; 13.229,8.729 14.986,9.743 15.931,8.107 14.175,7.093 ; -23.01,-8.701 ccw(c0,0) -8.701,-23.01 8.701,-23.01 ccw(c0,0) 23.01,-8.701 23.01,8.701 ccw(c0,0) 8.701,23.01 -8.701,23.01 ccw(c0,0) -23.01,8.701 -23.01,-8.701 ; -20,-7.89 ccw(c0,0) -16.833,-13.376 -3.167,-21.265 ccw(c0,0) 3.167,-21.265 16.833,-13.376 ccw(c0,0) 20,-7.89 20,7.89 ccw(c0,0) 16.833,13.376 3.167,21.265 ccw(c0,0) -3.167,21.265 -16.833,13.376 ccw(c0,0) -20,7.89 -20,-7.89 ; -14.444,-2.99 ccw(c-0.029,-0.008) -14.004,-4.632 -13.133,-4.399 ccw(c0,0) -9.537,-10.043 -10.116,-10.734 ccw(c-0.049,-0.061) -8.814,-11.827 -8.235,-11.136 ccw(c0,0) 7.233,-11.811 7.75,-12.55 ccw(c0,0) 9.142,-11.575 8.625,-10.836 ccw(c0,0) 13.697,-2.052 14.595,-2.13 ccw(c0,0) 14.744,-0.437 13.845,-0.358 ccw(c0,0) 1.65,13.751 1.65,14.657 ccw(c0,0) -1.65,14.657 -1.65,13.751 ccw(c0,0) -13.573,-2.757 -14.444,-2.99
  text "B28F" at -1.812,17.681 h1.2
  text "25" at -10.869,-7.459 h1.2
  text "28" at 2.031,-12.509 h1.2
  text "20" at -1.068,12.299 h1.2
  text "15" at 9.032,-7.385 h1.2
  text "10" at -3.774,-2.757 h1.2
  text "5" at 5.404,-5.087 h1.2
  text "1" at 2.418,-1.887 h1.2
Mechanical 8:
  lines w0.1: -11,0 -10,0 ; -10.25,-3.8 -9.25,-3.8 ; -10.25,3.8 -9.25,3.8 ; -10,-1 -10,0 ; -10,1 -10,0 ; -9.25,-4.8 -9.25,-3.8 ; -9.25,-2.8 -9.25,-3.8 ; -9.25,2.8 -9.25,3.8 ; -9.25,4.8 -9.25,3.8 ; -9,0 -10,0 ; -8.25,-3.8 -9.25,-3.8 ; -8.25,3.8 -9.25,3.8 ; -8.05,-7.05 -7.05,-7.05 ; -8.05,7.05 -7.05,7.05 ; -7.05,-8.05 -7.05,-7.05 ; -7.05,-6.05 -7.05,-7.05 ; -7.05,6.05 -7.05,7.05 ; -7.05,8.05 -7.05,7.05 ; -7,-0.5 -6,-0.5 ; -6.05,-7.05 -7.05,-7.05 ; -6.05,7.05 -7.05,7.05 ; -6,-1.5 -6,-0.5 ; -6,0.5 -6,-0.5 ; -5.9,3.45 -4.9,3.45 ; -5.25,-4.25 -4.25,-4.25 ; -5,-0.5 -6,-0.5 ; -4.9,2.45 -4.9,3.45 ; -4.9,4.45 -4.9,3.45 ; -4.8,-9.25 -3.8,-9.25 ; -4.8,9.25 -3.8,9.25 ; -4.25,-5.25 -4.25,-4.25 ; -4.25,-3.25 -4.25,-4.25 ; -3.9,3.45 -4.9,3.45 ; -3.8,-10.25 -3.8,-9.25 ; -3.8,-8.25 -3.8,-9.25 ; -3.8,8.25 -3.8,9.25 ; -3.8,10.25 -3.8,9.25 ; -3.25,-4.25 -4.25,-4.25 ; -3.2,0.6 -2.2,0.6 ; -2.8,-9.25 -3.8,-9.25 ; -2.8,9.25 -3.8,9.25 ; -2.55,5.8 -1.55,5.8 ; -2.2,-0.4 -2.2,0.6 ; -2.2,1.6 -2.2,0.6 ; -1.55,4.8 -1.55,5.8 ; -1.55,6.8 -1.55,5.8 ; -1.5,-6 -0.5,-6 ; -1.2,0.6 -2.2,0.6 ; -1,-10 0,-10 ; -1,10 0,10 ; -0.55,5.8 -1.55,5.8 ; -0.5,-7 -0.5,-6 ; -0.5,-5 -0.5,-6 ; -0.5,0 0,0 ; -0.4,-2.2 0.6,-2.2 ; 0,-11 0,-10 ; 0,-9 0,-10 ; 0,-0.5 0,0 ; 0,0.5 0,0 ; 0,9 0,10 ; 0,11 0,10 ; 0.5,-6 -0.5,-6 ; 0.5,0 0,0 ; 0.6,-3.2 0.6,-2.2 ; 0.6,-1.2 0.6,-2.2 ; 0.6,1.65 1.6,1.65 ; 1,-10 0,-10 ; 1,10 0,10 ; 1.55,5.45 2.55,5.45 ; 1.6,-2.2 0.6,-2.2 ; 1.6,0.65 1.6,1.65 ; 1.6,2.65 1.6,1.65 ; 2.4,-4.9 3.4,-4.9 ; 2.55,4.45 2.55,5.45 ; 2.55,6.45 2.55,5.45 ; 2.6,1.65 1.6,1.65 ; 2.8,-9.25 3.8,-9.25 ; 2.8,9.25 3.8,9.25 ; 3.4,-5.9 3.4,-4.9 ; 3.4,-3.9 3.4,-4.9 ; 3.55,5.45 2.55,5.45 ; 3.8,-10.25 3.8,-9.25 ; 3.8,-8.25 3.8,-9.25 ; 3.8,8.25 3.8,9.25 ; 3.8,10.25 3.8,9.25 ; 4.4,-4.9 3.4,-4.9 ; 4.4,2.55 5.4,2.55 ; 4.75,-1.55 5.75,-1.55 ; 4.8,-9.25 3.8,-9.25 ; 4.8,9.25 3.8,9.25 ; 5.4,1.55 5.4,2.55 ; 5.4,3.55 5.4,2.55 ; 5.75,-2.55 5.75,-1.55 ; 5.75,-0.55 5.75,-1.55 ; 6.05,-7.05 7.05,-7.05 ; 6.05,7.05 7.05,7.05 ; 6.4,2.55 5.4,2.55 ; 6.75,-1.55 5.75,-1.55 ; 7.05,-8.05 7.05,-7.05 ; 7.05,-6.05 7.05,-7.05 ; 7.05,6.05 7.05,7.05 ; 7.05,8.05 7.05,7.05 ; 8.05,-7.05 7.05,-7.05 ; 8.05,7.05 7.05,7.05 ; 8.25,-3.8 9.25,-3.8 ; 8.25,3.8 9.25,3.8 ; 9,0 10,0 ; 9.25,-4.8 9.25,-3.8 ; 9.25,-2.8 9.25,-3.8 ; 9.25,2.8 9.25,3.8 ; 9.25,4.8 9.25,3.8 ; 10,-1 10,0 ; 10,1 10,0 ; 10.25,-3.8 9.25,-3.8 ; 10.25,3.8 9.25,3.8 ; 11,0 10,0
Mechanical 14:
  circle w0.1: c-9.25,-3.8 r1.65
  circle w0.1: c1.6,1.65 r1.65
  circle w0.1: c5.75,-1.55 r1.65
  circle w0.1: c-6,-0.5 r1.65
  circle w0.1: c9.25,-3.8 r1.65
  circle w0.1: c0,-10 r1.65
  circle w0.1: c0,10 r1.65
  circle w0.1: c0,0 r15.85
  circle w0.1: c0,0 r20
  circle w0.1: c0,0 r22
  lines w0.1: -14.739,7.418 ccw(c0,0) -0.945,-16.473 ; -14.175,7.092 -15.931,8.107 -14.986,9.743 -13.229,8.729 ; -13.793,9.055 cw(c0,0) 13.793,9.055 ; -9.681,-1.619 -9.57,-2.181 ; -9.681,1.619 -9.57,2.181 ; -8.325,-5.166 -7.975,-5.684 ; -8.325,5.166 -7.975,5.684 ; -5.684,-7.975 -5.166,-8.325 ; -5.684,7.975 -5.166,8.325 ; -5.557,1.09 -5.343,1.86 ; -5.302,-1.995 -4.948,-2.755 ; -3.549,4.398 -2.901,4.852 ; -2.804,16.26 2.804,16.26 ; -2.755,-4.948 -1.995,-5.302 ; -2.181,-9.57 -1.619,-9.681 ; -2.181,9.57 -1.619,9.681 ; -1.033,-0.567 -0.567,-1.033 ; -0.945,-15.822 -0.945,-17.85 0.945,-17.85 0.945,-15.822 ; -0.61,1.039 0.01,1.211 ; 0.094,5.66 0.906,5.59 ; 0.816,-6.995 2.484,-8.255 ; 0.945,-16.473 ccw(c0,0) 14.738,7.418 ; 1.619,9.681 2.181,9.57 ; 1.788,-3.345 2.212,-3.755 ; 3.707,4.273 4.243,3.727 ; 4.348,-3.549 4.802,-2.901 ; 5.166,-8.325 5.684,-7.975 ; 5.166,8.325 5.684,7.975 ; 5.54,0.906 5.61,0.094 ; 7.451,-12.122 7.668,-12.433 ; 7.975,-5.684 8.325,-5.166 ; 7.975,5.684 8.325,5.166 ; 8.843,-11.147 9.061,-11.458 ; 9.57,-2.181 9.681,-1.619 ; 9.57,2.181 9.681,1.619 ; 13.229,8.729 14.986,9.743 15.931,8.107 14.175,7.093 ; -23.01,-8.701 ccw(c0,0) -8.701,-23.01 8.701,-23.01 ccw(c0,0) 23.01,-8.701 23.01,8.701 ccw(c0,0) 8.701,23.01 -8.701,23.01 ccw(c0,0) -23.01,8.701 -23.01,-8.701 ; -20,-7.89 ccw(c0,0) -16.833,-13.376 -3.167,-21.265 ccw(c0,0) 3.167,-21.265 16.833,-13.376 ccw(c0,0) 20,-7.89 20,7.89 ccw(c0,0) 16.833,13.376 3.167,21.265 ccw(c0,0) -3.167,21.265 -16.833,13.376 ccw(c0,0) -20,7.89 -20,-7.89 ; -14.444,-2.99 ccw(c-0.029,-0.008) -14.004,-4.632 -13.133,-4.399 ccw(c0,0) -9.537,-10.043 -10.116,-10.734 ccw(c-0.049,-0.061) -8.814,-11.827 -8.235,-11.136 ccw(c0,0) 7.233,-11.811 7.75,-12.55 ccw(c0,0) 9.142,-11.575 8.625,-10.836 ccw(c0,0) 13.697,-2.052 14.595,-2.13 ccw(c0,0) 14.744,-0.437 13.845,-0.358 ccw(c0,0) 1.65,13.751 1.65,14.657 ccw(c0,0) -1.65,14.657 -1.65,13.751 ccw(c0,0) -13.573,-2.757 -14.444,-2.99
  text "B28F" at -1.812,17.681 h1.2
  text "25" at -10.869,-7.459 h1.2
  text "28" at 2.031,-12.509 h1.2
  text "20" at -1.068,12.299 h1.2
  text "15" at 9.032,-7.385 h1.2
  text "10" at -3.774,-2.757 h1.2
  text "5" at 5.404,-5.087 h1.2
  text "1" at 2.418,-1.887 h1.2
3D body "SOURIAU_UT072028S21E86T.stp": height 26.5, standoff -3.6, extent -23.01,-23.01 23.01,23.01
3D body "SOURIAU_UT072028S21E86T_NUT.stp": height 9.72, standoff 6.29, extent -20,-21.5 20,21.5